# Altium integrated library OIS_Anakart.IntLib: 54 symbols
Pins are listed as number, name and electrical type; pins without a type are passive.

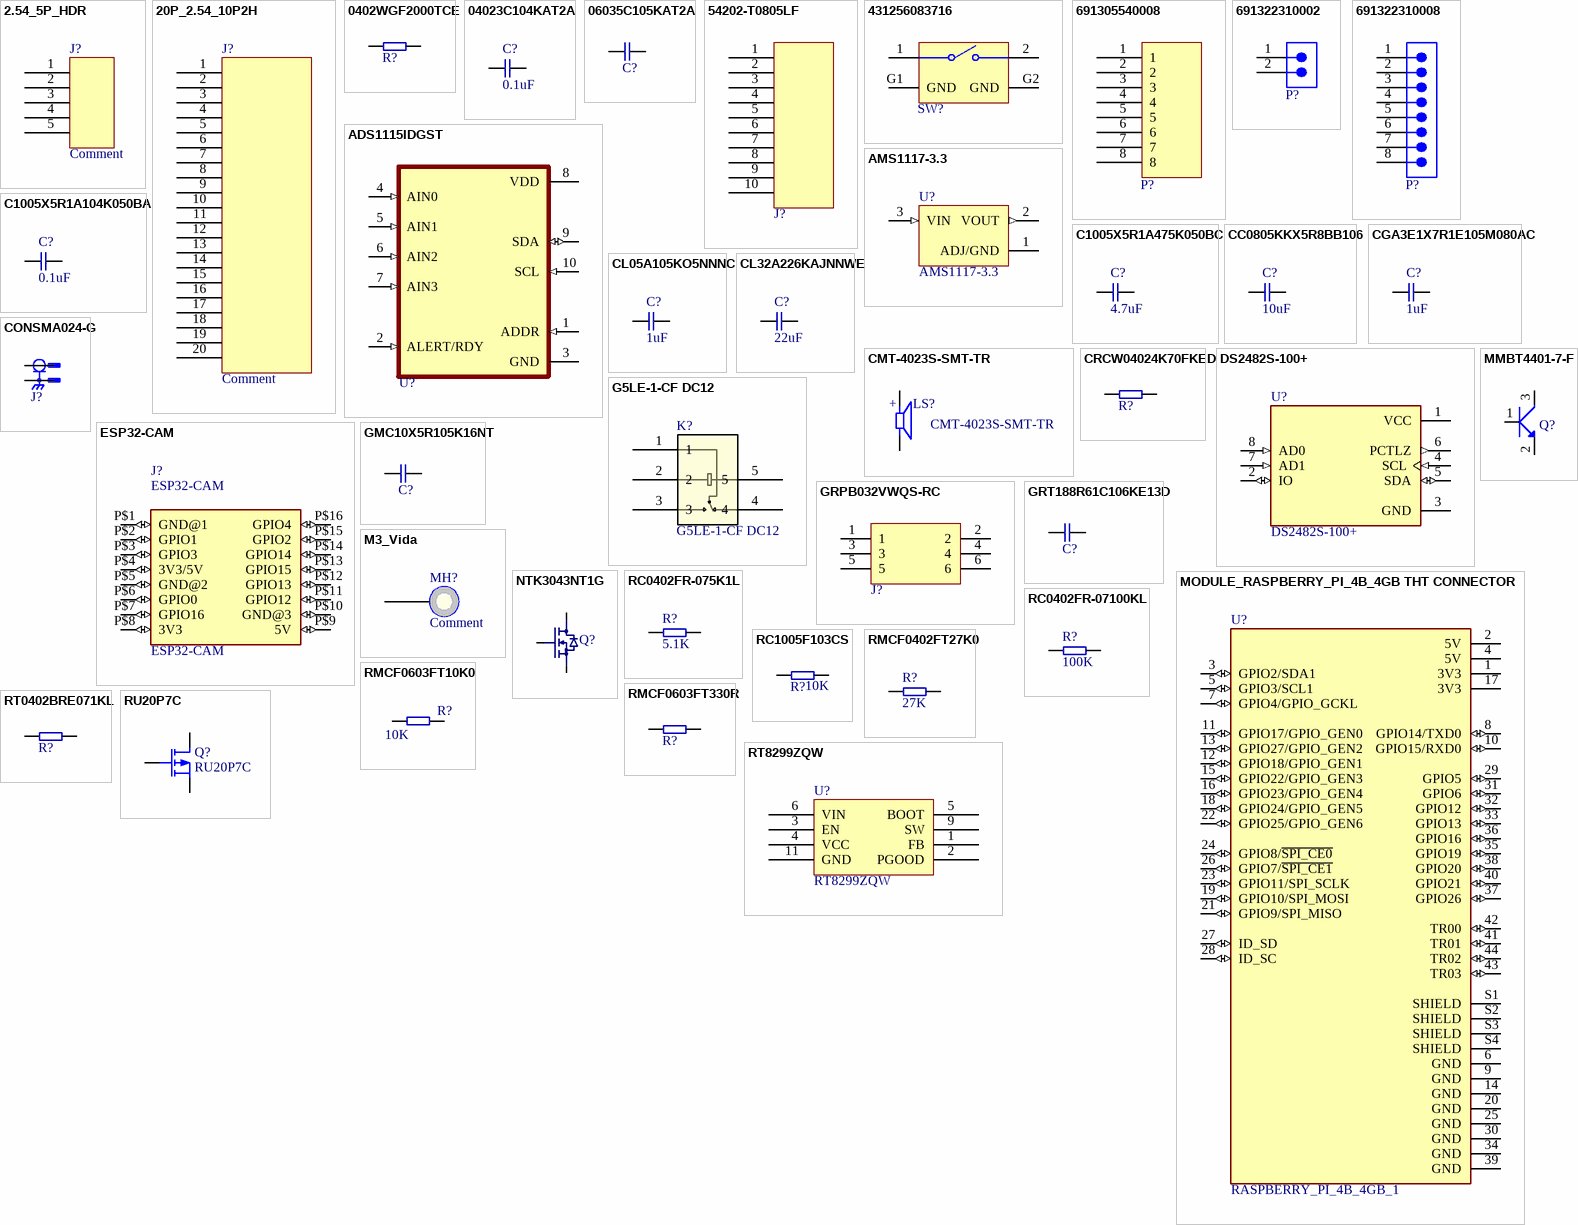
[diagram p0: symbols 2.54_5P_HDR to RU20P7C]

## 2.54_5P_HDR
designator J?, comment Comment
2.54_5P_HDR; Que: 091; Part Number: 2.54_5P_HDR
footprint 2.54_5P
pins: 1, 2, 3, 4, 5

## 20P_2.54_10P2H
designator J?, comment Comment
20P_2.54_10P2H; Que: 115; Part Number: 20P_2.54_10P2H
footprint 20P_2.54_10P2H
pins: 1, 2, 3, 4, 5, 6, 7, 8, 9, 10, 11, 12, 13, 14, 15, 16, 17, 18, 19, 20

## 0402WGF2000TCE
designator R?, comment 200R  (value not drawn)
RES.(1005) 0402 200 Ohms 1% 1/16W 100PPM; Part Number: 0402WGF2000TCE; Que: 165
footprint R0402
pins: 1, 2

## 04023C104KAT2A
designator C?, comment 0.1uF
CAP CER 0.1UF 25V X7R 0402; Part Number: 04023C104KAT2A; Manufacturer: AVX Corporation; Que: 009; Tolerance: ±10%; Type: Ceramic; Name: Recep Aydin; Voltage: 25V; Temperature Coefficient: X7R; Package: 0402(1005 Metric); Datasheet: https://datasheets.avx.com/X7RDielectric.pdf; Manufacturer Part Number: 04023C104KAT2A
footprint C0402
pins: 1, 2

## 06035C105KAT2A
designator C?, comment 1uF  (value not drawn)
CAP CER 1UF 50V X7R 0603; Part Number: 06035C105KAT2A; Manufacturer: KYOCERA AVX; Que: 082; Tolerance: ±10%; Type: Ceramic; Name: Recep Aydin; Voltage: 50V; Temperature Coefficient: X7R; Package: 0603(1608 Metric); Datasheet: https://datasheets.avx.com/X7RDielectric.pdf; Manufacturer Part Number: 06035C105KAT2A
footprint C0603
pins: 1, 2

## 54202-T0805LF
designator J?  (value not drawn)
CONN HEADER SMD 10POS 2.54MM; Manufacturer: Amphenol ICC (FCI); Que: 056; Number of Position: 10; Connector Style: Header,Male Pin; Name: Ahmet Kemal Ayyildiz; Part Number: 54202-T0805LF; Mounting Type: Surface Mount; Contact Finish: Tin; Datasheet: http://portal.fciconnect.com/Comergent//fci/drawing/54202.pdf; Manufacturer Part Number: 54202-T0805LF; Date: 02.02.2022
footprint 10P_2.54MM_SMD
pins: 1, 2, 3, 4, 5, 6, 7, 8, 9, 10

## 431256083716
designator SW?  (value not drawn)
THT Tact Switch 6x6 mm Right Angled; Manufacturer: Wurth Elektronik; Match Code: WS-TATU; Circuit: SPST-NO; Operation Force: 160g; Rated Current: 50mA; Rated Voltage: 12VDC; Washable: No; Que: 014; ComponentLink1Description: Website Link; ComponentLink1URL: https://www.we-online.com/redexpert/article/431256083716?ad; ComponentLink2Description: Datasheet Link; ComponentLink2URL: https://www.we-online.com/redexpert/spec/431256083716?ad; Manufacturer Part Number: 431256083716; Category: Tact Switches; Mount: Through Hole; Operating Temperature Max: 85°C; Operating Temperature Min: -40°C; Packaging: Bulk; Length: 6mm; Width: 6mm; Height: 8.35mm; Contact Material: Stainless Steel; Contact Plating: Silver; Terminal Material: Copper Alloy; Terminal Plating: Silver; Part Number: 431256083716
footprint 4312560837x6
pins: 1, 2, G1 GND, G2 GND

## 691305540008
designator P?, comment Comment  (value not drawn)
Part Number: 691305540008; Que: 150
footprint 691305540008
pins: 1, 2, 3, 4, 5, 6, 7, 8

## 691322310002
designator P?  (value not drawn)
WR-TBL Series 322 - 3.81 mm Horizontal 2 pin; Manufacturer: Wurth Elektronik; Modularity: No; Pitch: 3.81mm; Rated Current: 10A; Working Voltage: 300V; Que: 170; ComponentLink1Description: Website Link; ComponentLink1URL: https://www.we-online.com/redexpert/article/691322310002?ad; ComponentLink2Description: Datasheet Link; ComponentLink2URL: https://www.we-online.com/redexpert/spec/691322310002?ad; Manufacturer Part Number: 691322310002; Category: Terminal Blocks; Match Code: WR-TBL; Mount: Through Hole; Operating Temperature Max: 105°C; Operating Temperature Min: -40°C; Packaging: Box; Application: Pluggable; Number of Pins: 2; Number of Rows: 1; Orientation: Horizontal; Part Number: 691322310002
footprint 691322310002
pins: 1, 2

## 691322310008
designator P?  (value not drawn)
WR-TBL Series 322 - 3.81 mm Horizontal 8 pin; Manufacturer: Wurth Elektronik; Modularity: No; Pitch: 3.81mm; Rated Current: 10A; Working Voltage: 300V; Que: 172; ComponentLink1Description: Website Link; ComponentLink1URL: https://www.we-online.com/redexpert/article/691322310008?ad; ComponentLink2Description: Datasheet Link; ComponentLink2URL: https://www.we-online.com/redexpert/spec/691322310008?ad; Manufacturer Part Number: 691322310008; Category: Terminal Blocks; Match Code: WR-TBL; Mount: Through Hole; Operating Temperature Max: 105°C; Operating Temperature Min: -40°C; Packaging: Box; Application: Pluggable; Number of Pins: 8; Number of Rows: 1; Orientation: Horizontal; Part Number: 691322310008
footprint 691322310008
pins: 1, 2, 3, 4, 5, 6, 7, 8

## ADS1115IDGST
designator U?  (value not drawn)
IC ADC 16BIT SIGMA-DELTA 10VSSOP; Manufacturer: Texas Instruments; Que: 047; Name: İbrahim Akbulut; Package: 10VSSOP; Availability: Unavailable; Value: *; MP: ADS1115IDGST; Price: None; Part Number: ADS1115IDGST; Function: ADC; Datasheet: https://www.digikey.com/en/products/detail/texas-instruments/ADS1115IDGST/2123284; Manufacturer Part Number: ADS1115IDGST
footprint SOP50P490X110-10N
footprint ADS1115IDGST
pins: 1 ADDR (in), 2 ALERT/RDY (in), 3 GND (power), 4 AIN0 (in), 5 AIN1 (in), 6 AIN2 (in), 7 AIN3 (in), 8 VDD (power), 9 SDA (io), 10 SCL (in)

## AMS1117-3.3
designator U?
IC-1117 V.REG. 1A 3V3 SOT223 SMD AMS; Que: 021; VoltageIN: 4.8V; VoltageOUT: 3.3V; Name: Ahmet Kemal Ayyildiz; Part Number: AMS1117-3.3; Type: Positive Fixed; Package: SOT223; Datasheet: https://cdn.ozdisan.com/ETicaret_Dosya/348307_6210366.pdf; Manufacturer: AMS; Manufacturer Part Number: AMS1117-3.3
footprint AMS1117-3.3
pins: 1 ADJ/GND (power), 2 VOUT (out), 3 VIN (in)

## C1005X5R1A104K050BA
designator C?, comment 0.1uF
CAP CER 0.1UF 10V X5R 0402; Part Number: C1005X5R1A104K050BA; Manufacturer: TDK Corporation; Que: 003; Tolerance: ±10%; Type: Ceramic; Name: Recep Aydin; Voltage: 10V; Temperature Coefficient: X5R; Package: 0402(1005 Metric); Datasheet: https://product.tdk.com/en/system/files?file=dam/doc/product/capacitor/ceramic/mlcc/catalog/mlcc_commercial_general_en.pdf; Manufacturer Part Number: C1005X5R1A104K050BA
footprint C0402
pins: 1, 2

## C1005X5R1A475K050BC
designator C?, comment 4.7uF
CAP CER 4.7UF 10V X5R 0402; Part Number: C1005X5R1A475K050BC; Manufacturer: TDK Corporation; Que: 021; Tolerance: ±10%; Type: Ceramic; Name: Recep Aydin; Voltage: 10V; Temperature Coefficient: X5R; Package: 0402(1005 Metric); Datasheet: https://product.tdk.com/en/system/files?file=dam/doc/product/capacitor/ceramic/mlcc/catalog/mlcc_commercial_general_en.pdf; Manufacturer Part Number: C1005X5R1A475K050BC
footprint C0402
pins: 1, 2

## CC0805KKX5R8BB106
designator C?, comment 10uF
CAP CER 10UF 25V X5R 0805; Part Number: CC0805KKX5R8BB106; Manufacturer: YAGEO; Que: 074; Tolerance: ±10%; Type: Ceramic; Name: Recep Aydin; Voltage: 25V; Temperature Coefficient: X5R; Package: 0805(2012 Metric); Datasheet: https://www.yageo.com/upload/media/product/productsearch/datasheet/mlcc/UPY-GPHC_X5R_4V-to-50V_26.pdf; Manufacturer Part Number: CC0805KKX5R8BB106
footprint C0805
pins: 1, 2

## CGA3E1X7R1E105M080AC
designator C?, comment 1uF
CAP CER 1UF 25V X7R 0603; Part Number: CGA3E1X7R1E105M080AC; Manufacturer: TDK Corporation; Que: 017; Tolerance: ±20%; Type: Ceramic; Name: Recep Aydin; Voltage: 25V; Temperature Coefficient: X7R; Package: 0603(1608 Metric); Datasheet: https://product.tdk.com/en/system/files?file=dam/doc/product/capacitor/ceramic/mlcc/catalog/mlcc_automotive_general_en.pdf; Manufacturer Part Number: CGA3E1X7R1E105M080AC
footprint C0603
pins: 1, 2

## CL05A105KO5NNNC
designator C?, comment 1uF
CAP CER 1UF 16V X5R 0402; Part Number: CL05A105KO5NNNC; Manufacturer: Samsung Electro-Mechanics; Que: 077; Tolerance: ±10%; Type: Ceramic; Name: Recep Aydin; Voltage: 16V; Temperature Coefficient: X5R; Package: 0402(1005 Metric); Datasheet: https://media.digikey.com/pdf/Data%20Sheets/Samsung%20PDFs/CL05A105KO5NNNC_Spec_5-2-19.pdf; Manufacturer Part Number: CL05A105KO5NNNC
footprint C0402
pins: 1, 2

## CL32A226KAJNNWE
designator C?, comment 22uF
CAP CER 22UF 25V X5R 1210; Part Number: CL32A226KAJNNWE; Manufacturer: Samsung Electro-Mechanics; Que: 018; Tolerance: ±10%; Type: Ceramic; Name: Recep Aydin; Voltage: 25V; Temperature Coefficient: X5R; Package: 1210(3225 Metric); Datasheet: https://www.samsungsem.com/kr/support/product-search/mlcc/CL32A226KAJNNWE.jsp; Manufacturer Part Number: CL32A226KAJNNWE
footprint C1210
pins: 1, 2

## CMT-4023S-SMT-TR
designator LS?
AUDIO MAGNETIC XDCR 2-4V SMD; Manufacturer: CUI; Voltage Rating: 3V; Frequency: 4kHz; Operating Supply Current: 90mA; Supplier 1: Digi-Key; Stock 1: 2591; Pricing 1: 1=2.78, 10=2.3, 25=2.1236, 50=1.9952, 100=1.8717, 500=1.6036, 1000=1.586 (USD); Mount: Surface Mount; Min Operating Temperature: -20°C; Max Operating Temperature: 70°C; Sensing Method: Magnetic; Packaging: Tape and Reel; Termination: Solder; Length: 4mm; Width: 4mm; Lead Free: Lead Free; ComponentLink1URL: https://www.cui.com/product/resource/digikeypdf/cmt-4023s-smt.pdf?src-supplier=Digi-Key; ComponentLink1Description: https://www.cui.com/product/resource/digikeypdf/cmt-4023s-smt.pdf?src-supplier=Digi-Key; ComponentLink2URL: http://www.cui.com/product/resource/digikeypdf/cmt-4023s-smt.pdf?src-supplier=Digi-Key; ComponentLink2Description: http://www.cui.com/product/resource/digikeypdf/cmt-4023s-smt.pdf?src-supplier=Digi-Key; Supplier Part Number 1: 102-3742-1-ND; Manufacturer Part Number: CMT-4023S-SMT-TR
footprint Buzzer
pins: N, P
text: +

## CONSMA024-G
designator J?  (value not drawn)
Edge Mount SMA; MF: Linx Technologies; Que: 117; SPN: 343-CONSMA024-G-ND; Check_prices: https://www.snapeda.com/parts/CONSMA024-G/Linx/view-part/5168349/?ref=eda; Purchase-URL: https://pricing.snapeda.com/search/part/CONSMA024-G/?ref=eda; SnapEDA_Link: https://www.snapeda.com/parts/CONSMA024-G/Linx/view-part/5168349/?ref=snap; Value: *; MP: CONSMA024-G; Package: Custom Linx Technologies Inc.; Price: None; Availability: In Stock; Part Number: CONSMA024-G; Mounting Type: Edge; Datasheet: https://linxtechnologies.com/wp/wp-content/uploads/consma024-g-ds.pdf
footprint LINX_CONSMA024-G
pins: 1, G1 2, G2 2

## CRCW04024K70FKED
designator R?, comment 4.7K  (value not drawn)
RES SMD 4.7K OHM 1% 1/16W 0402; Part Number: CRCW04024K70FKED; Manufacturer: Vishay Dale; Que: 017; Tolerance: 0.1%; Name: Recep Aydin; Resistor Type: Thick Film; Package: 0402; Datasheet: https://www.vishay.com/docs/20035/dcrcwe3.pdf; Manufacturer Part Number: CRCW04024K70FKED
footprint R0402
pins: 1, 2

## DS2482S-100+
designator U?
IC BRIDGE I2C TO 1-WIRE 8-SOIC; MF: Maxim Integrated; Que: 080; Value: *; Availability: Unavailable; Package: SOIC-8 Maxim; SnapEDA_Link: https://www.snapeda.com/parts/DS2482S-100+/Maxim%20Integrated/view-part/587620/?ref=snap; Price: None; MP: DS2482S-100+; Part Number: DS2482S-100+
footprint SOIC127P600X175-8N
footprint Footprints/InterfaceIC.PcbLib
pins: 1 VCC (power), 2 IO (io), 3 GND (power), 4 SCL (in), 5 SDA (io), 6 PCTLZ (out), 7 AD1 (in), 8 AD0 (in)

## ESP32-CAM
designator J?
CAMERA MODULE; MF: AI-Thinker; Que: 041; SnapEDA_Link: https://www.snapeda.com/parts/ESP32-CAM/AI-Thinker/view-part/?ref=snap; Package: None; Value: *; MP: ESP32-CAM; Check_prices: https://www.snapeda.com/parts/ESP32-CAM/AI-Thinker/view-part/?ref=eda; Part Number: ESP32-CAM
footprint ESP32-CAM
pins: P$1 GND@1 (io), P$2 GPIO1 (io), P$3 GPIO3 (io), P$4 3V3/5V (io), P$5 GND@2 (io), P$6 GPIO0 (io), P$7 GPIO16 (io), P$8 3V3 (io), P$9 5V (io), P$10 GND@3 (io), P$11 GPIO12 (io), P$12 GPIO13 (io), P$13 GPIO15 (io), P$14 GPIO14 (io), P$15 GPIO2 (io), P$16 GPIO4 (io)

## G5LE-1-CF DC12
designator K?
Mfr_Name: Omron; Que: 038; Copyright: Copyright (C) 2023 Ultra Librarian. All rights reserved.; Manufacturer_Part_Number: G5LE-1-CF DC12; RefDes: RefDes; Type: DEV; Part Number: G5LE-1-CF DC12
footprint RELAY_G5LE-1 DC5_OMR
pins: 1, 2, 3, 4, 5

## GMC10X5R105K16NT
designator C?, comment 1uF  (value not drawn)
CAP CER 1UF 16V X5R 0603; Part Number: GMC10X5R105K16NT; Manufacturer: CAL-CHIP ELECTRONICS, INC.; Que: 020; Tolerance: ±10%; Type: Ceramic; Name: Recep Aydin; Voltage: 16V; Temperature Coefficient: X5R; Package: 0603(1608 Metric); Datasheet: http://www.calchipelectronics.com/pdf/gmc_series.pdf; Manufacturer Part Number: GMC10X5R105K16NT
footprint C0603
pins: 1, 2

## GRPB032VWQS-RC
designator J?  (value not drawn)
CONN HEADER SMD 6POS 1.27MM; Manufacturer: Sullins Connector Solutions; Que: 052; Number of Position: 6; Connector Style: Header,Female Pin; Name: Ahmet Kemal Ayyildiz; Part Number: GRPB032VWQS-RC; Mounting Type: Surface Mount; Contact Finish: Gold; Datasheet: https://s3.amazonaws.com/catalogspreads-pdf/PAGE94-95%20.050%20MALE%20HDR%20ST%20RA%20SMT.pdf; Manufacturer Part Number: GRPB032VWQS-RC; Date: 25-01-2022
footprint CONN_6P_1.27MM
pins: 1, 2, 3, 4, 5, 6

## GRT188R61C106KE13D
designator C?, comment 10uF  (value not drawn)
CAP CER 10UF 16V X5R 0603; Part Number: GRT188R61C106KE13D; Manufacturer: Murata Electronics; Que: 073; Tolerance: ±10%; Type: Ceramic; Name: Recep Aydin; Voltage: 16V; Temperature Coefficient: X5R; Package: 0603(1608 Metric); Datasheet: https://search.murata.co.jp/Ceramy/image/img/A01X/G101/ENG/GRT188R61C106KE13-01.pdf; Manufacturer Part Number: GRT188R61C106KE13D
footprint C0603
pins: 1, 2

## M3_Vida
designator MH?, comment Comment  (no BOM)
Part Number: M3_Vida; Que: 022; DesignItemID: Mounting Hole; Created On: 13.02.2020; Created By: Recep Aydin; Category: Miscellaneous
footprint Hole
footprint Mounting_Hole
footprint m3_3.2x6
pins: 1

## MMBT4401-7-F
designator Q?  (value not drawn)
TRANS NPN 40V 0.6A SMD SOT23-3; Manufacturer: Diodes Incorporated; Que: 007; Vce Saturation: 750mV @ 50mA, 500mA; DC Current Gain: 100 @ 150mA, 1V; Frequency: 250Mhz; Name: Recep Aydin; Part Number: MMBT4401-7-F; Type: NPN; Package: SOT-23-3; Datasheet: https://www.diodes.com/assets/Datasheets/ds30039.pdf; Manufacturer Part Number: MMBT4401-7-F
footprint SOT-23
pins: 1 B, 2 E, 3 C

## MODULE_RASPBERRY_PI_4B_4GB THT CONNECTOR
designator U?, comment RASPBERRY_PI_4B_4GB_1
MODULE_RASPBERRY_PI_4B_4GB; Part Number: MODULE_RASPBERRY_PI_4B_4GB THT CONNECTOR; MF: Raspberry Pi; MP: RASPBERRY PI 4B/4GB; Que: 040; Price: None; Check_prices: https://www.snapeda.com/parts/RASPBERRY%20PI%204B/4GB/Raspberry+Pi/view-part/?ref=eda; Value: *; Purchase-URL: https://pricing.snapeda.com/search/part/RASPBERRY PI 4B/4GB/?ref=eda; Availability: In Stock; SnapEDA_Link: https://www.snapeda.com/parts/RASPBERRY%20PI%204B/4GB/Raspberry+Pi/view-part/?ref=snap; Package: None
footprint MODULE_RASPBERRY_PI_4B_4GB
footprint MODULE_RASPBERRY_PI_4B_4GB_2
pins: 1 3V3 (power), 2 5V (power), 3 GPIO2/SDA1 (io), 4 5V (power), 5 GPIO3/SCL1 (io), 6 GND (power), 7 GPIO4/GPIO_GCKL (io), 8 GPIO14/TXD0 (io), 9 GND (power), 10 GPIO15/RXD0 (io), 11 GPIO17/GPIO_GEN0 (io), 12 GPIO18/GPIO_GEN1 (io), 13 GPIO27/GPIO_GEN2 (io), 14 GND (power), 15 GPIO22/GPIO_GEN3 (io), 16 GPIO23/GPIO_GEN4 (io), 17 3V3 (power), 18 GPIO24/GPIO_GEN5 (io), 19 GPIO10/SPI_MOSI (io), 20 GND (power), 21 GPIO9/SPI_MISO (io), 22 GPIO25/GPIO_GEN6 (io), 23 GPIO11/SPI_SCLK (io), 24 GPIO8/~{SPI_CE0} (io), 25 GND (power), 26 GPIO7/~{SPI_CE1} (io), 27 ID_SD (io), 28 ID_SC (io), 29 GPIO5 (io), 30 GND (power), 31 GPIO6 (io), 32 GPIO12 (io), 33 GPIO13 (io), 34 GND (power), 35 GPIO19 (io), 36 GPIO16 (io), 37 GPIO26 (io), 38 GPIO20 (io), 39 GND (power), 40 GPIO21 (io), 41 TR01 (io), 42 TR00 (io), 43 TR03 (io), 44 TR02 (io), S1 SHIELD (power), S2 SHIELD (power), S3 SHIELD (power), S4 SHIELD (power)

## NTK3043NT1G
designator Q?  (value not drawn)
MOSFET N-CH 20V 210MA SOT-723; Manufacturer: ON Semiconductor; Input Capacitance: 11pF; Power Dissipation: 440mW; Drain to Source Resistance: 3.4R; Gate to Source Voltage (Vgs): 10V; Current Rating: 225mA; Rise Time: 15ns; Number of Elements: 1; Max Power Dissipation: 310mW; Turn-Off Delay Time: 94ns; Turn-On Delay Time: 13ns; Threshold Voltage: 400mV; Element Configuration: Single; Supplier 1: Digi-Key; Supplier Part Number 1: NTK3043NT1GOSCT-ND; Manufacturer Part Number: NTK3043NT1G; Stock 1: 34914; Pricing 1: 1=0.42, 10=0.384, 100=0.2148, 500=0.1151, 1000=0.0782 (USD); Case/Package: SOT-723-3; Number of Pins: 3; Contact Plating: Tin,Matte; Min Operating Temperature: -55°C; Max Operating Temperature: 150°C; Packaging: Tape and Reel; Drain to Source Voltage (Vdss): 20V; Continuous Drain Current (ID): 210mA; Drain to Source Breakdown Voltage: 20V; Voltage Rating (DC): 20V; Package Quantity: 1; Rds On Max: 3.4R; Fall Time: 15ns; On-State Resistance: 3.4R; Length: 1.25mm; Height: 0.55mm; Width: 0.85mm; Radiation Hardening: No; Lead Free: Lead Free; REACH SVHC: No SVHC; ComponentLink1URL: https://datasheet.ciiva.com/26145/ntk3043n-d-26145937.pdf; ComponentLink1Description: https://datasheet.ciiva.com/26145/ntk3043n-d-26145937.pdf; ComponentLink2URL: https://datasheet.ciiva.com/30479/0900766b81206050-30479911.pdf; ComponentLink2Description: https://datasheet.ciiva.com/30479/0900766b81206050-30479911.pdf; ComponentLink3URL: https://datasheet.ciiva.com/11168/ntk3043n-d-11168406.pdf; ComponentLink3Description: https://datasheet.ciiva.com/11168/ntk3043n-d-11168406.pdf; ComponentLink4URL: https://datasheet.ciiva.com/16289/ntk3043n-d-16289766.pdf; ComponentLink4Description: https://datasheet.ciiva.com/16289/ntk3043n-d-16289766.pdf; ComponentLink5URL: https://datasheet.ciiva.com/16486/ntk3043n-d-16486375.pdf; ComponentLink5Description: https://datasheet.ciiva.com/16486/ntk3043n-d-16486375.pdf; ComponentLink6URL: https://datasheet.ciiva.com/11168/ntk3043n-d-11168408.pdf; ComponentLink6Description: https://datasheet.ciiva.com/11168/ntk3043n-d-11168408.pdf; ComponentLink7URL: https://datasheet.ciiva.com/8059/ntk3043n-d-8059515.pdf; ComponentLink7Description: https://datasheet.ciiva.com/8059/ntk3043n-d-8059515.pdf; ComponentLink8URL: https://datasheet.ciiva.com/947/ntk3043n-d-947052.pdf; ComponentLink8Description: https://datasheet.ciiva.com/947/ntk3043n-d-947052.pdf; ComponentLink9URL: https://datasheet.ciiva.com/947/ntk3043n-d-947053.pdf; ComponentLink9Description: https://datasheet.ciiva.com/947/ntk3043n-d-947053.pdf; ComponentLink10URL: https://datasheet.ciiva.com/947/ntk3043n-d-947054.pdf; ComponentLink10Description: https://datasheet.ciiva.com/947/ntk3043n-d-947054.pdf
footprint SC105-3
pins: 1 G, 2 S, 3 D

## RC0402FR-075K1L
designator R?, comment 5.1K
RES 5.1K OHM 1% 1/16W 0402; Part Number: RC0402FR-075K1L; Manufacturer: YAGEO; Que: 089; Name: Recep Aydin; Tolerance: 1%; Resistor Type: Thick Film; Package: 0402; Datasheet: https://www.yageo.com/upload/media/product/productsearch/datasheet/rchip/PYu-RC_Group_51_RoHS_L_11.pdf; Manufacturer Part Number: RC0402FR-075K1L
footprint R0402
pins: 1, 2

## RC0402FR-07100KL
designator R?, comment 100K
RES SMD 100K OHM 1% 1/16W 0402; Part Number: RC0402FR-07100KL; Manufacturer: YAGEO; Que: 055; Name: Recep Aydin; Tolerance: 1%; Resistor Type: Thick Film; Package: 0402; Datasheet: https://www.yageo.com/upload/media/product/productsearch/datasheet/rchip/PYu-RC_Group_51_RoHS_L_11.pdf; Manufacturer Part Number: RC0402FR-07100KL
footprint R0402
pins: 1, 2

## RC1005F103CS
designator R?, comment 10K
RES SMD 10K OHM 1% 1/16W 0402; Part Number: RC1005F103CS; Manufacturer: Samsung Electro-Mechanics; Que: 004; Tolerance: 0.1%; Name: Recep Aydin; Resistor Type: Thick Film; Package: 0402; Datasheet: https://media.digikey.com/pdf/Data%20Sheets/Samsung%20PDFs/RC_Series_ds.pdf; Manufacturer Part Number: RC1005F103CS
footprint R0402
pins: 1, 2

## RMCF0402FT27K0
designator R?, comment 27K
RES 27K OHM 1% 1/16W 0402; Part Number: RMCF0402FT27K0; Manufacturer: Stackpole Electronics Inc; Que: 142; Name: Ahmet Kemal Ayyildiz; Tolerance: ±1%; Resistor Type: Thick Film; Package: 0402; Datasheet: https://www.seielect.com/catalog/sei-rmcf_rmcp.pdf; Manufacturer Part Number: RMCF0402FT27K0
footprint R0402
pins: 1, 2

## RMCF0603FT10K0
designator R?, comment 10K
RES 10K OHM 1% 1/10W 0603; Part Number: RMCF0603FT10K0; Manufacturer: Stackpole Electronics Inc; Que: 051; Name: Recep Aydin; Tolerance: 1%; Resistor Type: Thick Film; Package: 0603; Datasheet: https://www.seielect.com/catalog/sei-rmcf_rmcp.pdf; Manufacturer Part Number: RMCF0603FT10K0
footprint R0603
pins: 1, 2

## RMCF0603FT330R
designator R?, comment 330R  (value not drawn)
RES 330 OHM 1% 1/10W 0603; Part Number: RMCF0603FT330R; Manufacturer: Stackpole Electronics Inc; Que: 002; Tolerance: 0.1%; Name: Recep Aydin; Resistor Type: Thick Film; Package: 0603; Datasheet: https://www.seielect.com/catalog/sei-rmcf_rmcp.pdf; Manufacturer Part Number: RMCF0603FT330R
footprint R0603
pins: 1, 2

## RT0402BRE071KL
designator R?, comment 1K  (value not drawn)
RES SMD 1K OHM 0.1% 1/16W 0402; Part Number: RT0402BRE071KL; Manufacturer: Yageo; Que: 015; Name: Recep Aydin; Tolerance: 0.1%; Resistor Type: Thick Film; Package: 0402; Datasheet: https://www.yageo.com/upload/media/product/productsearch/datasheet/rchip/PYu-RT_1-to-0.01_RoHS_L_12.pdf; Manufacturer Part Number: RT0402BRE071KL
footprint R0402
pins: 1, 2

## RT8299ZQW
designator U?
IC REG BUCK ADJUSTABLE 3A 10WDFN; Manufacturer: Richtek USA Inc.; Que: 025; VoltageIN: 3V-24V; VoltageOUT: 0.8V-15V; Name: Ahmet Kemal Ayyildiz; Part Number: RT8299ZQW; Type: Buck; Package: 10-WFDFN Exposed Pad; Datasheet: https://www.richtek.com/assets/product_file/RT8299/DS8299-05.pdf; Manufacturer Part Number: RT8299ZQW
footprint RT8299ZQW
pins: 1 FB, 2 PGOOD (power), 3 EN, 4 VCC (power), 5 BOOT, 6 VIN, 7 VIN, 8 SW, 9 SW, 10 GND, 11 GND

## RU20P7C
designator Q?
20V 5A 28m?@4.5V,5A 1.3W 1.1V@250?A P Channel; Mfg: Shenzhen ruichips Semicon; Vendor: LCSC; Vendor PN: C181984; Que: 009; Type: PMOS; Mfg PN: RU20P7C; Part Number: RU20P7C; Package: SOT-23-3; Datasheet: https://datasheet.lcsc.com/szlcsc/2008251903_Shenzhen-ruichips-Semicon-RU20P7C_C181984.pdf
footprint SOT-23-3
pins: 1 D, 2 G, 3 S

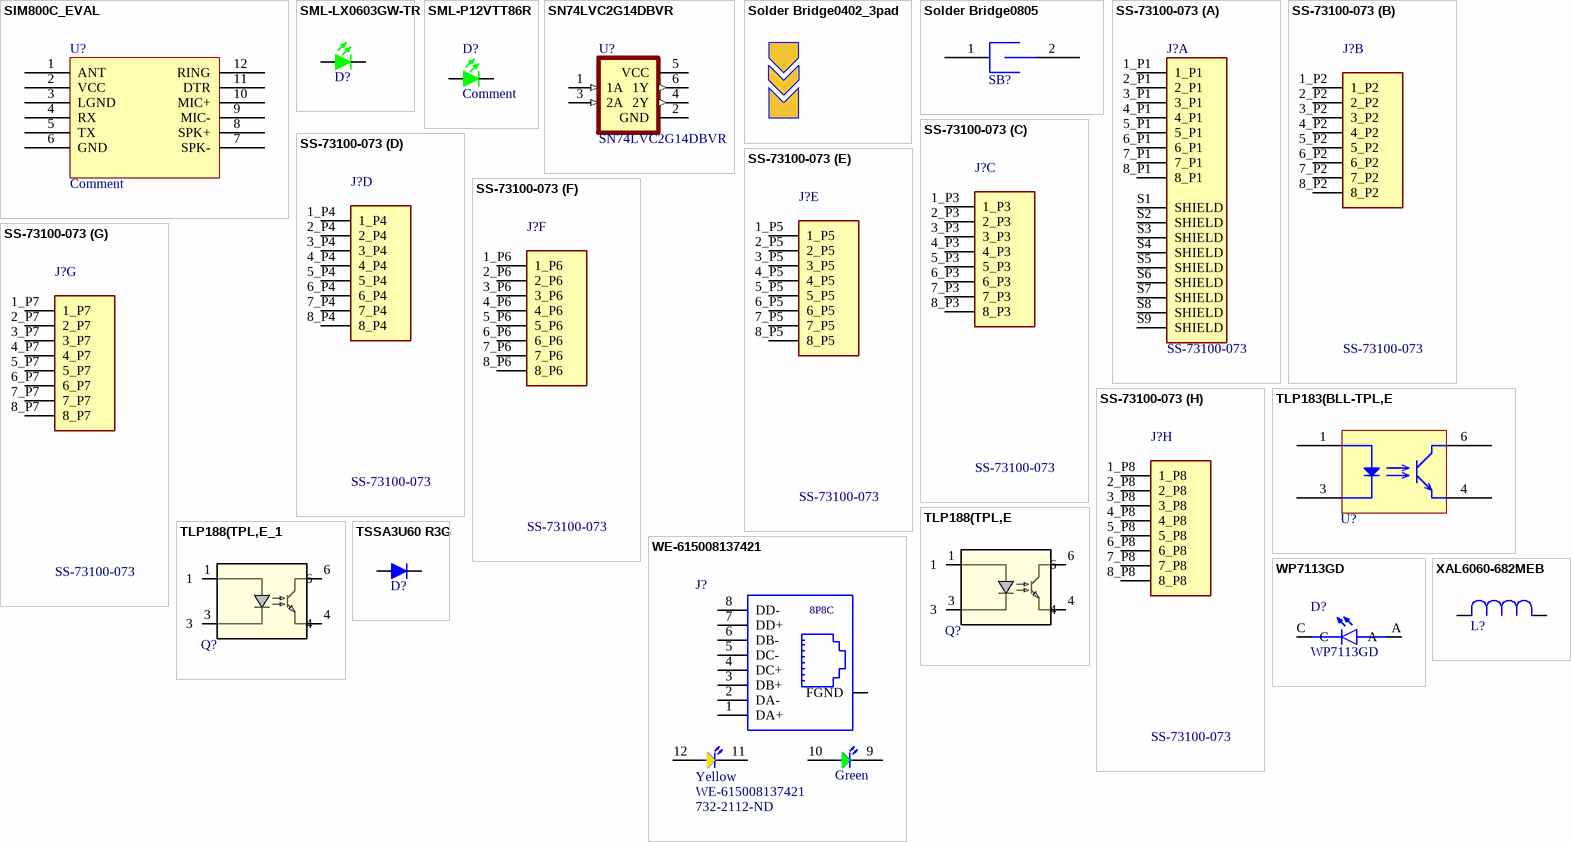
[diagram p1: symbols SIM800C_EVAL to XAL6060-682MEB]

## SIM800C_EVAL
designator U?, comment Comment
Part Number: SIM800C_EVAL; Que: 042
footprint SIM800C_EVAL
pins: 1 ANT, 2 VCC, 3 LGND, 4 RX, 5 TX, 6 GND, 7 SPK-, 8 SPK+, 9 MIC-, 10 MIC+, 11 DTR, 12 RING

## SML-LX0603GW-TR
designator D?  (value not drawn)
LED GREEN DIFFUSED SMD; Manufacturer: Lumex Opto/Components Inc.; Que: 001; Forward Voltage: 2.2V; Current: 20mA; Name: Recep Aydin; Part Number: SML-LX0603GW-TR; LensTransparency: Diffused; Color: Green; Package: 0603(1608 Metric); Datasheet: https://www.lumex.com/datasheet/SML-LX0603GW-TR; Manufacturer Part Number: SML-LX0603GW-TR
footprint L0603
pins: A, C

## SML-P12VTT86R
designator D?, comment Comment
LED RED CLEAR 0402 SMD; Part Number: SML-P12VTT86R; Que: 005; Forward Voltage: 2V; Current: 20mA; Color: Red; Package: 0402 (1006 Metric)
footprint L0402_A
pins: A, C

## SN74LVC2G14DBVR
designator U?
Dual Schmitt-Trigger Inverter 6-SOT-23 -40 to 125; MF: Texas Instruments; Value: *; SnapEDA_Link: https://www.snapeda.com/parts/SN74LVC2G14DBVR/Texas%20Instruments/view-part/77482/?ref=snap; Texas_Instruments-Purchase-URL: https://snapeda.com/shop?store=Texas+Instruments&id=77482; Mouser-Purchase-URL: https://snapeda.com/shop?store=Mouser&id=77482; Price: None; Availability: Unavailable; Package: SOT-23-6 Texas Instruments; DigiKey-Purchase-URL: https://snapeda.com/shop?store=DigiKey&id=77482; MP: SN74LVC2G14DBVR
footprint SOT95P280X145-6N
pins: 1 1A (in), 2 GND (power), 3 2A (in), 4 2Y (out), 5 VCC (power), 6 1Y (out)

## Solder Bridge0402_3pad
designator JMP?, comment Jumper  (value not drawn)
0402 Solder Bridge 3 PAD; Part Number: Solder Bridge0402_3pad; Que: 008; Name: Recep Aydin
footprint SB0402_3PAD
pins: 1, 2, 3

## Solder Bridge0805
designator SB?, comment Jumper  (value not drawn)
0805 Solder Bridge; Part Number: Solder Bridge0805; Que: 006; Name: Recep Aydin
footprint SB.0805
pins: 1, 2

## SS-73100-073
designator J?
Jack Modular Connector RJ45, Ethernet RA; MF: Stewart Connector; Que: 174; SnapEDA_Link: https://www.snapeda.com/parts/SS-73100-073/Stewart%20Connector/view-part/79069/?ref=snap; MP: SS-73100-073; Digi-Key_Part_Number: SS-73100-073F-ND; Package: None; Value: *; Check_prices: https://www.snapeda.com/parts/SS-73100-073/Stewart%20Connector/view-part/79069/?ref=eda; Part Number: SS-73100-073
footprint BEL_SS-73100-073
part A pins: 1_P1, 2_P1, 3_P1, 4_P1, 5_P1, 6_P1, 7_P1, 8_P1, S1 SHIELD, S2 SHIELD, S3 SHIELD, S4 SHIELD, S5 SHIELD, S6 SHIELD, S7 SHIELD, S8 SHIELD, S9 SHIELD
part B pins: 1_P2, 2_P2, 3_P2, 4_P2, 5_P2, 6_P2, 7_P2, 8_P2
part C pins: 1_P3, 2_P3, 3_P3, 4_P3, 5_P3, 6_P3, 7_P3, 8_P3
part D pins: 1_P4, 2_P4, 3_P4, 4_P4, 5_P4, 6_P4, 7_P4, 8_P4
part E pins: 1_P5, 2_P5, 3_P5, 4_P5, 5_P5, 6_P5, 7_P5, 8_P5
part F pins: 1_P6, 2_P6, 3_P6, 4_P6, 5_P6, 6_P6, 7_P6, 8_P6
part G pins: 1_P7, 2_P7, 3_P7, 4_P7, 5_P7, 6_P7, 7_P7, 8_P7
part H pins: 1_P8, 2_P8, 3_P8, 4_P8, 5_P8, 6_P8, 7_P8, 8_P8

## TLP183(BLL-TPL,E
designator U?  (value not drawn)
OPTOISO 3.75KV TRANS 6-SO 4 LEAD; Manufacturer: Toshiba; Que: 003; NumberofChannels: 1; Voltage-Isolation: 3750Vrms; Output Type: Transistor; Output Current: 50mA; Forward Voltage: 1.25V; Name: Recep Aydin; Part Number: TLP183(BLL-TPL,E; Current DC Forward: 50mA; Package: 6-SOIC; Datasheet: https://www.digikey.com/en/products/detail/toshiba-semiconductor-and-storage/TLP183-BLL-TPL-E/4562835; Manufacturer Part Number: TLP183(BLL-TPL,E
footprint TLP183(BLL-TPL,E
pins: 1 A, 3 C, 4 Emi, 6 Col

## TLP188(TPL,E
designator Q?  (value not drawn)
IC-188 OPTOISO 3.75KV TRANS SO6; Mfr_Name: Toshiba Electronic Devices & Storage Corp.; Type: DEV; Number_devices_in_Package: 1; Que: 012; Copyright: Copyright (C) 2023 Ultra Librarian. All rights reserved.; Manufacturer_Part_Number: TLP188(TPL,E; RefDes: RefDes; Source_Package: TLP188; Part Number: TLP188(TPL,E
footprint 4pin SO6_TOS
footprint OptoCoupler
pins: 1, 3, 4, 6

## TLP188(TPL,E_1
designator Q?, comment TLP188(TPL,E(TPL,E  (value not drawn)
IC-188 OPTOISO 3.75KV TRANS SO6; Mfr_Name: Toshiba Electronic Devices & Storage Corp.; Type: DEV; Number_devices_in_Package: 1; Que: 012; Copyright: Copyright (C) 2023 Ultra Librarian. All rights reserved.; Manufacturer_Part_Number: TLP188(TPL,E; RefDes: RefDes; Source_Package: TLP188; Part Number: TLP188(TPL,E
footprint 4pin SO6_TOS
footprint OptoCoupler
pins: 1, 3, 4, 6

## TSSA3U60 R3G
designator D?  (value not drawn)
DIODE SCHOTTKY 60V 3A DO214AC; Manufacturer: Taiwan Semiconductor Corporation; Que: 003; Speed: Fast Recovery =< 500ns, > 200mA (Io); Name: Recep Aydin; Part Number: TSSA3U60 R3G; Diode Type: Schottky; Current: 3A; Package: DO-214AC; Datasheet: https://www.taiwansemi.com/assets/uploads/datasheet/TSSA3U60_F1612.pdf; Manufacturer Part Number: TSSA3U60 R3G
footprint TAIWAN_TSSA3U60 R3G
pins: A, C

## WE-615008137421
designator J?  Supplier Part Number 1: 732-2112-ND
WR-COM Modular Jack RJ45 Horizontal  Shielded  With LED With EMI panel ground Tab up - Left yellow - Right green; Manufacturer: Wurth Electronics; Current Rating: 1.5A; Mating Cycles: 500; Gender: Female; Connector Type: Jack,RJ45,Socket; Voltage Rating (AC): 120V; Number of Positions: 8; Number of Ports: 1; Insulation Resistance: 500MR; ComponentLink1URL: http://documents.rs-components.com/techlib://itc_doclist_GB.htm?stockno=7350298&src-supplier=RSComponents; ComponentLink2URL: http://www.mouser.com/ds/2/445/615008137421-537819.pdf?src-supplier=Mouser; Supplier 1: Digi-Key; Manufacturer Part Number: 615008137421; Stock 1: 2833; Pricing 1: 1=2.67, 10=2.621, 50=2.52, 100=2.419, 250=2.318 (USD); Mount: Through Hole,PCB; Contact Plating: Gold,Tin; Contact Material: Copper Alloy; Color: Black,Green,Yellow; Housing Material: PBT; Min Operating Temperature: -40°C; Max Operating Temperature: 85°C; Shielding: Shielded; Packaging: Tray; Package Quantity: 60; Number of Rows: 1; Termination: Through Hole; Direction: Up; Number of Contacts: 8; Orientation: Right Angle; Length: 13.46mm; Height: 16.93mm; Width: 16.25mm; Depth: 15.75mm; REACH SVHC: Unknown; Flammability Rating: UL94 V-0; ComponentLink1Description: http://documents.rs-components.com/techlib://itc_doclist_GB.htm?stockno=7350298&src-supplier=RSComponents; ComponentLink2Description: http://www.mouser.com/ds/2/445/615008137421-537819.pdf?src-supplier=Mouser; ComponentLink3URL: https://katalog.we-online.de/em/datasheet/615008137421.pdf?src-supplier=Digi-Key; ComponentLink3Description: https://katalog.we-online.de/em/datasheet/615008137421.pdf?src-supplier=Digi-Key; ComponentLink4URL: http://www.farnell.com/datasheets/76606.pdf?src-supplier=Newark; ComponentLink4Description: http://www.farnell.com/datasheets/76606.pdf?src-supplier=Newark; ComponentLink5URL: http://www.produktinfo.conrad.com/datenblaetter/1000000-1099999/001088215-da-01-en-WR_COM_MODULAR_JACK_615008137421.pdf?src-supplier=Conrad; ComponentLink5Description: http://www.produktinfo.conrad.com/datenblaetter/1000000-1099999/001088215-da-01-en-WR_COM_MODULAR_JACK_615008137421.pdf?src-supplier=Conrad
footprint 615008137421
pins: 1 DA+, 2 DA-, 3 DB+, 4 DC+, 5 DC-, 6 DB-, 7 DD+, 8 DD-, 9, 10, 11, 12, 13 FGND
text: 8P8C; Yellow; Green

## WP7113GD
designator D?
Green 568nm LED Indication THT; MF: Kingbright; Que: 013; Price: None; Availability: Unavailable; Package: Radial Kingbright; SnapEDA_Link: https://www.snapeda.com/parts/WP7113GD/Kingbright/view-part/573477/?ref=snap; MP: WP7113GD; Value: *; Part Number: WP7113GD
footprint LED_WP7113GD
pins: A, C

## XAL6060-682MEB
designator L?  (value not drawn)
6.8uH 9A 20.8mOhm Inductor; Manufacturer: Coilcraft; Que: 003; Filter Type: Molded; Name: Recep Aydin; Part Number: XAL6060-682MEB; Current Rating: 9 A; DC Resistance: 20.8 mOhm; Package: PINDC; Datasheet: https://www.mouser.com.tr/datasheet/2/597/xal60xx-270658.pdf; Manufacturer Part Number: XAL6060-682MEB
footprint CC_XAL6060-682MEB
pins: 1, 2